# Altium footprint library PcbLibLafe.PcbLib: 297 footprints (part 19 of 19)
Each footprint in its own frame and in the unit in brackets; x right, y up, seen from the top. Pads: shape width x height; smd on the part's side, far side on the other; paste and mask are expansions set on the pad; w line width, h text height; cw(c..) or ccw(c..) is an arc to the next point about the centre after c.
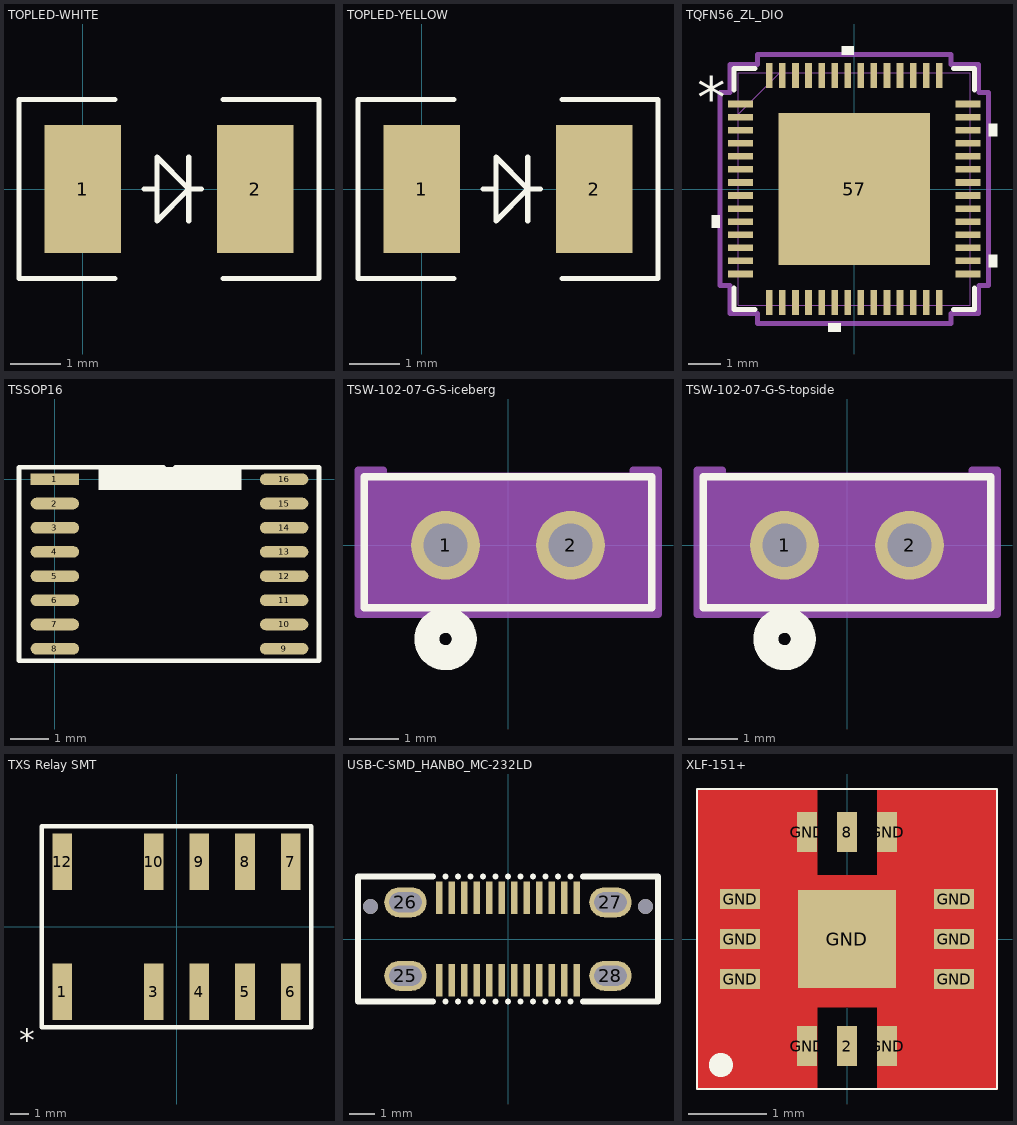
[diagram p18: the footprints below, top view; thin cyan lines are the x and y axes]

## TOPLED-WHITE [mil]
pads (2):
  rect 60x100 smd: 1(0,0) 2(135,0)
Top Overlay:
  lines w4: 25,-70 -50,-70 -50,70 25,70 ; 83,-25 83,0 ; 83,25 83,0 ; 93,0 83,0 ; 110,-70 185,-70 185,70 110,70 ; 58,0 58,-25 83,0 ; 58,0 48,0 58,0 ; 58,0 58,25 83,0
3D body: height 61, standoff 60, extent 30,-10 50,5
3D body: height 61, standoff 60, extent 54.69,-36.96 110.35,36.96
3D body: height 65, standoff 60, extent 60,-10 75,5
3D body: height 75, standoff 60, extent -2.8,-60 137.4,60
3D body: height 43.31, standoff 0, extent 142.32,-31.5 154.13,32.48
3D body: height 43.31, standoff 27.56, extent 137.4,-31.5 154.13,32.48
3D body: height 11.81, standoff 0, extent 115.75,-31.5 154.13,32.48
3D body: height 11.81, standoff 0, extent -19.53,-31.5 18.86,32.48
3D body: height 43.31, standoff 27.56, extent -19.53,-31.5 -2.8,32.48
3D body: height 43.31, standoff 0, extent -19.53,-31.5 -7.72,32.48
3D body: height 19.68, standoff 0, extent 40,-60 95,60
3D body: height 60, standoff 15, extent -2.8,-60 137.4,60
3D body: height 70, standoff 60, extent 30,-40 110,40
3D body: height 61, standoff 60, extent -2.8,-60 20,-37.2

## TOPLED-YELLOW [mil]
pads (2):
  rect 60x100 smd: 1(0,0) 2(135,0)
Top Overlay:
  lines w4: 25,-70 -50,-70 -50,70 25,70 ; 83,-25 83,0 ; 83,25 83,0 ; 93,0 83,0 ; 110,-70 185,-70 185,70 110,70 ; 58,0 58,-25 83,0 ; 58,0 48,0 58,0 ; 58,0 58,25 83,0
3D body: height 61, standoff 60, extent 30,-10 50,5
3D body: height 61, standoff 60, extent 54.69,-36.96 110.35,36.96
3D body: height 65, standoff 60, extent 60,-10 75,5
3D body: height 75, standoff 60, extent -2.8,-60 137.4,60
3D body: height 43.31, standoff 0, extent 142.32,-31.5 154.13,32.48
3D body: height 43.31, standoff 27.56, extent 137.4,-31.5 154.13,32.48
3D body: height 11.81, standoff 0, extent 115.75,-31.5 154.13,32.48
3D body: height 11.81, standoff 0, extent -19.53,-31.5 18.86,32.48
3D body: height 43.31, standoff 27.56, extent -19.53,-31.5 -2.8,32.48
3D body: height 43.31, standoff 0, extent -19.53,-31.5 -7.72,32.48
3D body: height 19.68, standoff 0, extent 40,-60 95,60
3D body: height 60, standoff 15, extent -2.8,-60 137.4,60
3D body: height 70, standoff 60, extent 30,-40 110,40
3D body: height 61, standoff 60, extent -2.8,-60 20,-37.2

## TQFN56_ZL_DIO [mil]
pads (57):
  rect 30x8 smd paste+0 mask+0: 1(-137,102.36) 2(-137,86.61) 3(-137,70.87) 4(-137,55.12) 5(-137,39.37) 6(-137,23.62) 7(-137,7.87) 8(-137,-7.87) 9(-137,-23.62) 10(-137,-39.37) 11(-137,-55.12) 12(-137,-70.87) 13(-137,-86.61) 14(-137,-102.36) 29(137,-102.36) 30(137,-86.61) 31(137,-70.87) 32(137,-55.12) 33(137,-39.37) 34(137,-23.62) 35(137,-7.87) 36(137,7.87) 37(137,23.62) 38(137,39.37) 39(137,55.12) 40(137,70.87) 41(137,86.61) 42(137,102.36)
  rect 8x30 smd paste+0 mask+0: 15(-102.36,-137) 16(-86.61,-137) 17(-70.87,-137) 18(-55.12,-137) 19(-39.37,-137) 20(-23.62,-137) 21(-7.87,-137) 22(7.87,-137) 23(23.62,-137) 24(39.37,-137) 25(55.12,-137) 26(70.87,-137) 27(86.61,-137) 28(102.36,-137) 43(102.36,137) 44(86.61,137) 45(70.87,137) 46(55.12,137) 47(39.37,137) 48(23.62,137) 49(7.87,137) 50(-7.87,137) 51(-23.62,137) 52(-39.37,137) 53(-55.12,137) 54(-70.87,137) 55(-86.61,137) 56(-102.36,137)
  rect 183x183 smd paste-91 mask+0: 57(0,0)
Top Overlay:
  region: -0.37,162 -15.37,162 -15.37,172 -0.37,172
  region: 162,78.37 172,78.37 172,63.37 162,63.37
  region: 162,-79.11 172,-79.11 172,-94.11 162,-94.11
  region: -16.12,-162 -31.12,-162 -31.12,-172 -16.12,-172
  region: -162,-31.87 -172,-31.87 -172,-46.87 -162,-46.87
  lines w6: -145,-119.46 -145,-145 -119.46,-145 ; -145,119.46 -145,145 -119.46,145 ; 119.46,-145 145,-145 145,-119.46 ; 119.46,145 145,145 145,119.46
  text "*" at -189.5,85.24 h50
Top Paste:
  region: 87.56,-34.44 34.44,-34.44 34.44,-87.56 87.56,-87.56
  region: 87.56,26.56 34.44,26.56 34.44,-26.56 87.56,-26.56
  region: 87.56,87.56 34.44,87.56 34.44,34.44 87.56,34.44
  region: 26.56,-34.44 -26.56,-34.44 -26.56,-87.56 26.56,-87.56
  region: 26.56,26.56 -26.56,26.56 -26.56,-26.56 26.56,-26.56
  region: 26.56,87.56 -26.56,87.56 -26.56,34.44 26.56,34.44
  region: -34.44,-34.44 -87.56,-34.44 -87.56,-87.56 -34.44,-87.56
  region: -34.44,26.56 -87.56,26.56 -87.56,-26.56 -34.44,-26.56
  region: -34.44,87.56 -87.56,87.56 -87.56,34.44 -34.44,34.44
Mechanical 13:
  lines w1: -140,90 -90,140 ; -140,-140 -140,140 140,140 140,-140 -140,-140 ; -140,-107.36 -140,-97.36 -140,-107.36 ; -140,-91.61 -140,-81.61 -140,-91.61 ; -140,-75.87 -140,-65.87 -140,-75.87 ; -140,-60.12 -140,-50.12 -140,-60.12 ; -140,-44.37 -140,-34.37 -140,-44.37 ; -140,-28.62 -140,-18.62 -140,-28.62 ; -140,-12.87 -140,-2.87 -140,-12.87 ; -140,2.87 -140,12.87 -140,2.87 ; -140,18.62 -140,28.62 -140,18.62 ; -140,34.37 -140,44.37 -140,34.37 ; -140,50.12 -140,60.12 -140,50.12 ; -140,65.87 -140,75.87 -140,65.87 ; -140,81.61 -140,91.61 -140,81.61 ; -140,97.36 -140,107.36 -140,97.36 ; -107.36,-140 -97.36,-140 -107.36,-140 ; -107.36,140 -97.36,140 -107.36,140 ; -91.61,-140 -81.61,-140 -91.61,-140 ; -91.61,140 -81.61,140 -91.61,140 ; -75.87,-140 -65.87,-140 -75.87,-140 ; -75.87,140 -65.87,140 -75.87,140 ; -60.12,-140 -50.12,-140 -60.12,-140 ; -60.12,140 -50.12,140 -60.12,140 ; -44.37,-140 -34.37,-140 -44.37,-140 ; -44.37,140 -34.37,140 -44.37,140 ; -28.62,-140 -18.62,-140 -28.62,-140 ; -28.62,140 -18.62,140 -28.62,140 ; -12.87,-140 -2.87,-140 -12.87,-140 ; -12.87,140 -2.87,140 -12.87,140 ; 2.87,-140 12.87,-140 2.87,-140 ; 2.87,140 12.87,140 2.87,140 ; 18.62,-140 28.62,-140 18.62,-140 ; 18.62,140 28.62,140 18.62,140 ; 34.37,-140 44.37,-140 34.37,-140 ; 34.37,140 44.37,140 34.37,140 ; 50.12,-140 60.12,-140 50.12,-140 ; 50.12,140 60.12,140 50.12,140 ; 65.87,-140 75.87,-140 65.87,-140 ; 65.87,140 75.87,140 65.87,140 ; 81.61,-140 91.61,-140 81.61,-140 ; 81.61,140 91.61,140 81.61,140 ; 97.36,-140 107.36,-140 97.36,-140 ; 97.36,140 107.36,140 97.36,140 ; 140,-107.36 140,-97.36 140,-107.36 ; 140,-91.61 140,-81.61 140,-91.61 ; 140,-75.87 140,-65.87 140,-75.87 ; 140,-60.12 140,-50.12 140,-60.12 ; 140,-44.37 140,-34.37 140,-44.37 ; 140,-28.62 140,-18.62 140,-28.62 ; 140,-12.87 140,-2.87 140,-12.87 ; 140,2.87 140,12.87 140,2.87 ; 140,18.62 140,28.62 140,18.62 ; 140,34.37 140,44.37 140,34.37 ; 140,50.12 140,60.12 140,50.12 ; 140,65.87 140,75.87 140,65.87 ; 140,81.61 140,91.61 140,81.61 ; 140,97.36 140,107.36 140,97.36
Mechanical 15:
  lines w6: -162,-116.36 -162,116.36 -150,116.36 -150,150 -116.36,150 -116.36,162 116.36,162 116.36,150 150,150 150,116.36 162,116.36 162,-116.36 150,-116.36 150,-150 116.36,-150 116.36,-162 -116.36,-162 -116.36,-150 -150,-150 -150,-116.36 -162,-116.36
3D body "TQFN56_ZL_DIO.step": height 32.09, standoff 0, extent -139.99,-139.99 140.01,140.01
3D body: height 10, standoff 0, extent 0,0 10,10

## TSSOP16 [mil]
pads (16):
  rect 50x12 smd: 1(0,0)
  oval 50x12 smd: 2(0,-25) 3(0,-50) 4(0,-75) 5(0,-100) 6(0,-125) 7(0,-150) 8(0,-175) 9(237,-175) 10(237,-150) 11(237,-125) 12(237,-100) 13(237,-75) 14(237,-50) 15(237,-25) 16(237,0)
Top Overlay:
  rectangle: 45,-11 193,12.5
  lines w5: 112.25,12.5 -37,12.5 -37,-187.5 273,-187.5 273,12.5 124.75,12.5
3D body: height 40, standoff 0, extent 24.04,-188 212,13
3D body: height 12, standoff 0, extent -11,-6 11,6
3D body: height 25, standoff 12, extent 2.5,-6 35,6
3D body: height 41, standoff 40, extent 79,-14 157,11
3D body: height 25, standoff 12, extent 2.5,-31 35,-19
3D body: height 12, standoff 0, extent -11,-31 11,-19
3D body: height 25, standoff 12, extent 2.5,-56 35,-44
3D body: height 12, standoff 0, extent -11,-56 11,-44
3D body: height 25, standoff 12, extent 2.5,-81 35,-69
3D body: height 12, standoff 0, extent -11,-81 11,-69
3D body: height 25, standoff 12, extent 2.5,-106 35,-94
3D body: height 12, standoff 0, extent -11,-106 11,-94
3D body: height 25, standoff 12, extent 2.5,-131 35,-119
3D body: height 12, standoff 0, extent -11,-131 11,-119
3D body: height 25, standoff 12, extent 2.5,-156 35,-144
3D body: height 12, standoff 0, extent -11,-156 11,-144
3D body: height 25, standoff 12, extent 2.5,-181 35,-169
3D body: height 12, standoff 0, extent -11,-181 11,-169
3D body: height 25, standoff 12, extent 202,-181 234.5,-169
3D body: height 12, standoff 0, extent 226,-181 248,-169
3D body: height 25, standoff 12, extent 202,-156 234.5,-144
3D body: height 12, standoff 0, extent 226,-156 248,-144
3D body: height 25, standoff 12, extent 202,-131 234.5,-119
3D body: height 12, standoff 0, extent 226,-131 248,-119
3D body: height 25, standoff 12, extent 202,-106 234.5,-94
3D body: height 12, standoff 0, extent 226,-106 248,-94
3D body: height 25, standoff 12, extent 202,-81 234.5,-69
3D body: height 12, standoff 0, extent 226,-81 248,-69
3D body: height 25, standoff 12, extent 202,-56 234.5,-44
3D body: height 12, standoff 0, extent 226,-56 248,-44
3D body: height 25, standoff 12, extent 202,-31 234.5,-19
3D body: height 12, standoff 0, extent 226,-31 248,-19
3D body: height 25, standoff 12, extent 202,-6 234.5,6
3D body: height 12, standoff 0, extent 226,-6 248,6

## TSW-102-07-G-S-iceberg [mil]
pads (2):
  round 55 / inner round 60 / far side round 55 hole 35 paste-99999 mask+0: 1(-50,0) 2(50,0)
Top Overlay:
  circle w20: c-50,-75 r15
  lines w6: -115,-50 -115,55 115,55 115,-50 -115,-50
Bottom Overlay:
  circle w20: c-50,-75 r15
Mechanical 13:
  circle w0: c-50,0 r10
  lines w1: -110,-45 -110,50 110,50 110,-45 -110,-45
Mechanical 15:
  region: 120,58 100,58 -100,58 -120,58 -120,-57 -100,-57 100,-57 120,-57
  lines w6: -120,-55 -100,-55 100,-55 120,-55 120,60 100,60 100,50 -100,50 -100,60 -120,60 -120,-55
3D body "TSW-102-07-G-S.stp": height 55, standoff -375, extent -105,-50 100,50

## TSW-102-07-G-S-topside [mil]
pads (2):
  round 55 / inner round 60 / far side round 55 hole 35 paste-99999 mask+0: 1(-50,0) 2(50,0)
Top Overlay:
  circle w20: c-50,-75 r15
  lines w6: -115,-50 115,-50 115,55 -115,55 -115,-50
Bottom Overlay:
  circle w20: c-50,-75 r15
Mechanical 13:
  circle w0: c-50,0 r10
  lines w1: -110,-45 110,-45 110,50 -110,50 -110,-45
Mechanical 15:
  region: 120,58 100,58 -100,58 -120,58 -120,-57 -100,-57 100,-57 120,-57
  lines w6: -120,-55 -120,60 -100,60 -100,50 100,50 100,60 120,60 120,-55 100,-55 -100,-55 -120,-55
3D body "TSW-102-07-G-S.stp": height 330, standoff -100, extent -105,-50 100,50

## TXS Relay SMT [mil] "SMT"
pads (10):
  rect 43x124 smd: 1(-250,-142.5) 3(-50,-142.5) 4(50,-142.5) 5(150,-142.5) 6(250,-142.5) 7(250,142.5) 8(150,142.5) 9(50,142.5) 10(-50,142.5) 12(-250,142.5)
Top Overlay:
  lines w10: -295.5,-220 295.5,-220 295.5,220 -295.5,220 -295.5,-220
  text "*" at -345,-274 h50
3D body "TXS2SA-LT-3V-Z--3DModel-STEP-56544.STEP": height 330.71, standoff 0, extent -290.28,-185.04 300.28,185.04

## USB-C-SMD_HANBO_MC-232LD [mm]
pads (30):
  rect 0.27x1.3 smd: 1(-2.75,1.65) 2(-2.25,1.65) 3(-1.75,1.65) 4(-1.25,1.65) 5(-0.75,1.65) 6(-0.25,1.65) 7(0.25,1.65) 8(0.75,1.65) 9(1.25,1.65) 10(1.75,1.65) 11(2.25,1.65) 12(2.75,1.65) 13(2.75,-1.65) 14(2.25,-1.65) 15(1.75,-1.65) 16(1.25,-1.65) 17(0.75,-1.65) 18(0.25,-1.65) 19(-0.25,-1.65) 20(-0.75,-1.65) 21(-1.25,-1.65) 22(-1.75,-1.65) 23(-2.25,-1.65) 24(-2.75,-1.65)
  oval 1.7x1.2 hole 0.8 slot 1.3 at 0 deg: 25(-4.1,-1.47) 26(-4.1,1.47) 27(4.1,1.47) 28(4.1,-1.47)
  round 0.6 hole 0.6 unplated: ""(-5.5,1.3) ""(5.5,1.3)
Top Overlay:
  lines w0.254: -2.998,-2.5 -6,-2.5 -6,2.5 -2.998,2.5 ; -2.502,-2.5 -2.498,-2.5 ; -2.502,2.5 -2.498,2.5 ; -2.002,-2.5 -1.998,-2.5 ; -2.002,2.5 -1.998,2.5 ; -1.502,2.5 -1.498,2.5 ; -1.502,-2.5 -1.498,-2.5 ; -1.002,-2.5 -0.998,-2.5 ; -1.002,2.5 -0.998,2.5 ; -0.502,-2.5 -0.498,-2.5 ; -0.502,2.5 -0.498,2.5 ; -0.002,-2.5 0.002,-2.5 ; -0.002,2.5 0.002,2.5 ; 0.498,-2.5 0.502,-2.5 ; 0.498,2.5 0.502,2.5 ; 0.998,-2.5 1.002,-2.5 ; 0.998,2.5 1.002,2.5 ; 1.498,-2.5 1.502,-2.5 ; 1.498,2.5 1.502,2.5 ; 1.998,-2.5 2.002,-2.5 ; 1.998,2.5 2.002,2.5 ; 2.498,-2.5 2.502,-2.5 ; 2.498,2.5 2.502,2.5 ; 2.998,-2.5 6,-2.5 6,2.5 2.998,2.5

## XLF-151+ [mil]
pads (13):
  rect 10x20 smd: 2(0,-53.5) 8(0,53.5) GND(-20,-53.5) GND(-20,53.5) GND(20,-53.5) GND(20,53.5)
  rect 20x10 smd: GND(-53.5,-20) GND(-53.5,0) GND(-53.5,20) GND(53.5,-20) GND(53.5,0) GND(53.5,20)
  rect 49x49 smd: GND(0,0)
Top Layer:
  region: -75,-75 -75,75 -15,75 -15,32 15,32 15,75 75,75 75,-75 15,-75 15,-34 -15,-34 -15,-75
Top Overlay:
  circle w10: c-63,-63 r1
  lines w1: -75,-75 75,-75 75,75 -75,75 -75,-75